# Altium schematic symbol library 13-Logic 数字 IC.SchLib: 324 symbols (part 7 of 30)

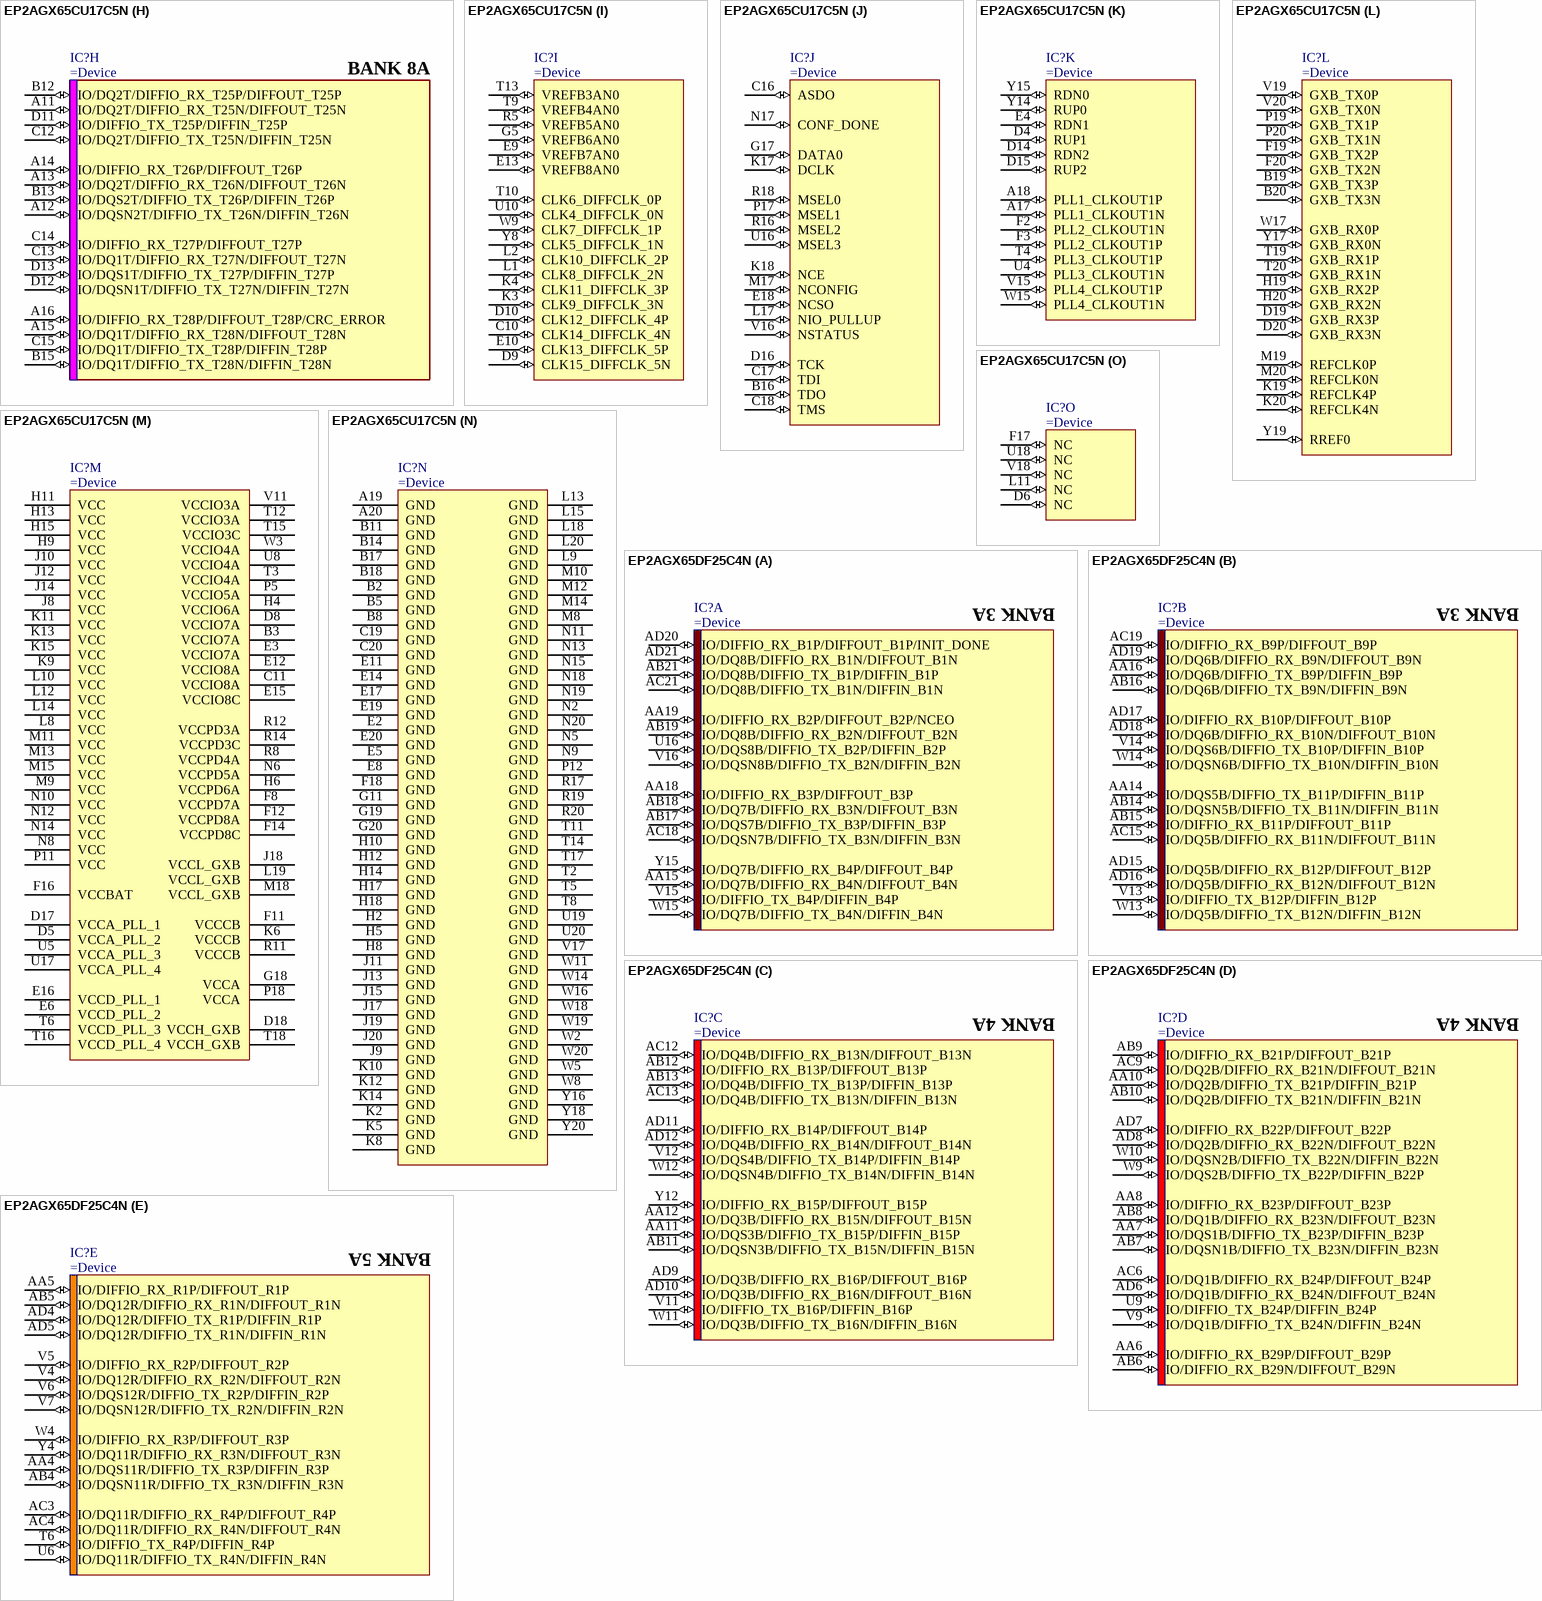
[diagram p38: symbols EP2AGX65CU17C5N to EP2AGX65DF25C4N]

## EP2AGX65CU17C5N
designator IC?
part A pins: U11 IO/DIFFIO_TX_B4P/DIFFIN_B4P (io), U12 IO/DQ5B/DIFFIO_TX_B4N/DIFFIN_B4N (io), U13 IO/DIFFIO_RX_B3P/DIFFOUT_B3P (io), U14 IO/DQS6B/DIFFIO_TX_B2P/DIFFIN_B2P (io), U15 IO/DQSN6B/DIFFIO_TX_B2N/DIFFIN_B2N (io), V12 IO/DQ5B/DIFFIO_RX_B3N/DIFFOUT_B3N (io), V13 IO/DQ6B/DIFFIO_TX_B1P/DIFFIN_B1P (io), V14 IO/DQ6B/DIFFIO_TX_B1N/DIFFIN_B1N (io), W10 IO/DQ5B/DIFFIO_RX_B4P/DIFFOUT_B4P (io), W12 IO/DIFFIO_RX_B2P/DIFFOUT_B2P/NCEO (io), W13 IO/DIFFIO_RX_B1P/DIFFOUT_B1P/INIT_DONE (io), Y9 IO/DQ5B/DIFFIO_RX_B4N/DIFFOUT_B4N (io), Y10 IO/DQS5B/DIFFIO_TX_B3P/DIFFIN_B3P (io), Y11 IO/DQSN5B/DIFFIO_TX_B3N/DIFFIN_B3N (io), Y12 IO/DQ6B/DIFFIO_RX_B2N/DIFFOUT_B2N (io), Y13 IO/DQ6B/DIFFIO_RX_B1N/DIFFOUT_B1N (io)
part B pins: U7 IO/DQS4B/DIFFIO_TX_B14P/DIFFIN_B14P (io), U9 IO/DIFFIO_TX_B16P/DIFFIN_B16P (io), V7 IO/DQSN4B/DIFFIO_TX_B14N/DIFFIN_B14N (io), V8 IO/DQ3B/DIFFIO_TX_B16N/DIFFIN_B16N (io), V9 IO/DQ4B/DIFFIO_TX_B13P/DIFFIN_B13P (io), V10 IO/DQ4B/DIFFIO_TX_B13N/DIFFIN_B13N (io), W1 IO/DQ3B/DIFFIO_RX_B16P/DIFFOUT_B16P (io), W6 IO/DIFFIO_RX_B14P/DIFFOUT_B14P (io), W7 IO/DIFFIO_RX_B13P/DIFFOUT_B13P (io), Y1 IO/DQ3B/DIFFIO_RX_B16N/DIFFOUT_B16N (io), Y2 IO/DQS3B/DIFFIO_TX_B15P/DIFFIN_B15P (io), Y3 IO/DQSN3B/DIFFIO_TX_B15N/DIFFIN_B15N (io), Y4 IO/DIFFIO_RX_B15P/DIFFOUT_B15P (io), Y5 IO/DQ3B/DIFFIO_RX_B15N/DIFFOUT_B15N (io), Y6 IO/DQ4B/DIFFIO_RX_B14N/DIFFOUT_B14N (io), Y7 IO/DQ4B/DIFFIO_RX_B13N/DIFFOUT_B13N (io)
part C pins: P3 IO/DQ1B/DIFFIO_RX_B24P/DIFFOUT_B24P (io), P4 IO/DIFFIO_RX_B29P/DIFFOUT_B29P (io), P6 IO/DQS2B/DIFFIO_TX_B22P/DIFFIN_B22P (io), R3 IO/DQ1B/DIFFIO_RX_B24N/DIFFOUT_B24N (io), R4 IO/DIFFIO_RX_B29N/DIFFOUT_B29N (io), R6 IO/DQSN2B/DIFFIO_TX_B22N/DIFFIN_B22N (io), T7 IO/DIFFIO_TX_B24P/DIFFIN_B24P (io), U1 IO/DQ1B/DIFFIO_RX_B23N/DIFFOUT_B23N (io), U2 IO/DIFFIO_RX_B23P/DIFFOUT_B23P (io), U3 IO/DQS1B/DIFFIO_TX_B23P/DIFFIN_B23P (io), U6 IO/DQ1B/DIFFIO_TX_B24N/DIFFIN_B24N (io), V1 IO/DQ2B/DIFFIO_RX_B22N/DIFFOUT_B22N (io), V2 IO/DIFFIO_RX_B22P/DIFFOUT_B22P (io), V3 IO/DQSN1B/DIFFIO_TX_B23N/DIFFIN_B23N (io), V4 IO/DIFFIO_RX_B21P/DIFFOUT_B21P (io), V5 IO/DQ2B/DIFFIO_TX_B21P/DIFFIN_B21P (io), V6 IO/DQ2B/DIFFIO_TX_B21N/DIFFIN_B21N (io), W4 IO/DQ2B/DIFFIO_RX_B21N/DIFFOUT_B21N (io)
part D pins: L3 IO/DQ3R/DIFFIO_RX_R4N/DIFFOUT_R4N (io), L4 IO/DQ3R/DIFFIO_RX_R4P/DIFFOUT_R4P (io), L5 IO/DQS3R/DIFFIO_TX_R3P/DIFFIN_R3P (io), M1 IO/DQ4R/DIFFIO_RX_R2N/DIFFOUT_R2N (io), M2 IO/DIFFIO_RX_R2P/DIFFOUT_R2P (io), M3 IO/DIFFIO_RX_R3P/DIFFOUT_R3P (io), M4 IO/DQSN3R/DIFFIO_TX_R3N/DIFFIN_R3N (io), M5 IO/DIFFIO_TX_R4P/DIFFIN_R4P (io), N1 IO/DIFFIO_RX_R1P/DIFFOUT_R1P (io), N3 IO/DQ3R/DIFFIO_RX_R3N/DIFFOUT_R3N (io), N4 IO/DQ3R/DIFFIO_TX_R4N/DIFFIN_R4N (io), P1 IO/DQ4R/DIFFIO_RX_R1N/DIFFOUT_R1N (io), P2 IO/DQ4R/DIFFIO_TX_R1P/DIFFIN_R1P (io), R1 IO/DQ4R/DIFFIO_TX_R1N/DIFFIN_R1N (io), R2 IO/DQS4R/DIFFIO_TX_R2P/DIFFIN_R2P (io), T1 IO/DQSN4R/DIFFIO_TX_R2N/DIFFIN_R2N (io)
part E pins: F4 IO/DQ1R/DIFFIO_TX_R32N/DIFFIN_R32N (io), F5 IO/DIFFIO_TX_R32P/DIFFIN_R32P/DEV_CLRN (io), F6 IO/DQS2R/DIFFIO_TX_R30P/DIFFIN_R30P/DATA1 (io), G1 IO/DQ1R/DIFFIO_RX_R32N/DIFFOUT_R32N (io), G2 IO/DQ1R/DIFFIO_RX_R32P/DIFFOUT_R32P (io), G3 IO/DQ2R/DIFFIO_TX_R29N/DIFFIN_R29N/DATA7 (io), G4 IO/DQ2R/DIFFIO_TX_R29P/DIFFIN_R29P/DATA5 (io), G6 IO/DQSN2R/DIFFIO_TX_R30N/DIFFIN_R30N/DATA3 (io), H1 IO/DQSN1R/DIFFIO_TX_R31N/DIFFIN_R31N (io), H3 IO/DIFFIO_RX_R30P/DIFFOUT_R30P/CLKUSR (io), J1 IO/DIFFIO_RX_R31P/DIFFOUT_R31P/DEV_OE (io), J2 IO/DQS1R/DIFFIO_TX_R31P/DIFFIN_R31P (io), J3 IO/DQ2R/DIFFIO_RX_R30N/DIFFOUT_R30N/DATA2 (io), J4 IO/DQ2R/DIFFIO_RX_R29N/DIFFOUT_R29N/DATA6 (io), J5 IO/DIFFIO_RX_R29P/DIFFOUT_R29P/DATA4 (io), K1 IO/DQ1R/DIFFIO_RX_R31N/DIFFOUT_R31N (io)
part F pins: A1 IO/DIFFIO_RX_T8P/DIFFOUT_T8P (io), A2 IO/DQ5T/DIFFIO_TX_T8N/DIFFIN_T8N (io), A3 IO/DQ5T/DIFFIO_TX_T8P/DIFFIN_T8P (io), B1 IO/DQ5T/DIFFIO_RX_T8N/DIFFOUT_T8N (io), C1 IO/DQ6T/DIFFIO_RX_T6N/DIFFOUT_T6N (io), C2 IO/DIFFIO_RX_T6P/DIFFOUT_T6P (io), C3 IO/DQSN6T/DIFFIO_TX_T6N/DIFFIN_T6N (io), C4 IO/DQ5T/DIFFIO_RX_T7N/DIFFOUT_T7N (io), C5 IO/DIFFIO_RX_T7P/DIFFOUT_T7P (io), D1 IO/DQ6T/DIFFIO_RX_T5N/DIFFOUT_T5N (io), D2 IO/DQ6T/DIFFIO_RX_T5P/DIFFOUT_T5P (io), D3 IO/DQS6T/DIFFIO_TX_T6P/DIFFIN_T6P (io), D7 IO/DQSN5T/DIFFIO_TX_T7N/DIFFIN_T7N (io), E1 IO/DIFFIO_TX_T5P/DIFFIN_T5P (io), E7 IO/DQS5T/DIFFIO_TX_T7P/DIFFIN_T7P (io), F1 IO/DQ6T/DIFFIO_TX_T5N/DIFFIN_T5N (io)
part G pins: A4 IO/DQ4T/DIFFIO_RX_T13N/DIFFOUT_T13N (io), A5 IO/DQ4T/DIFFIO_RX_T14N/DIFFOUT_T14N (io), A6 IO/DIFFIO_RX_T14P/DIFFOUT_T14P (io), A7 IO/DQ3T/DIFFIO_RX_T15N/DIFFOUT_T15N (io), A8 IO/DQ3T/DIFFIO_RX_T16N/DIFFOUT_T16N (io), A9 IO/DQ3T/DIFFIO_TX_T16N/DIFFIN_T16N (io), A10 IO/DQSN3T/DIFFIO_TX_T15N/DIFFIN_T15N (io), B4 IO/DQ4T/DIFFIO_RX_T13P/DIFFOUT_T13P (io), B6 IO/DIFFIO_RX_T15P/DIFFOUT_T15P (io), B7 IO/DIFFIO_RX_T16P/DIFFOUT_T16P (io), B9 IO/DQ3T/DIFFIO_TX_T16P/DIFFIN_T16P (io), B10 IO/DQS3T/DIFFIO_TX_T15P/DIFFIN_T15P (io), C6 IO/DQ4T/DIFFIO_TX_T13N/DIFFIN_T13N (io), C7 IO/DIFFIO_TX_T13P/DIFFIN_T13P (io), C8 IO/DQSN4T/DIFFIO_TX_T14N/DIFFIN_T14N (io), C9 IO/DQS4T/DIFFIO_TX_T14P/DIFFIN_T14P (io)
part H pins: A11 IO/DQ2T/DIFFIO_RX_T25N/DIFFOUT_T25N (io), A12 IO/DQSN2T/DIFFIO_TX_T26N/DIFFIN_T26N (io), A13 IO/DQ2T/DIFFIO_RX_T26N/DIFFOUT_T26N (io), A14 IO/DIFFIO_RX_T26P/DIFFOUT_T26P (io), A15 IO/DQ1T/DIFFIO_RX_T28N/DIFFOUT_T28N (io), A16 IO/DIFFIO_RX_T28P/DIFFOUT_T28P/CRC_ERROR (io), B12 IO/DQ2T/DIFFIO_RX_T25P/DIFFOUT_T25P (io), B13 IO/DQS2T/DIFFIO_TX_T26P/DIFFIN_T26P (io), B15 IO/DQ1T/DIFFIO_TX_T28N/DIFFIN_T28N (io), C12 IO/DQ2T/DIFFIO_TX_T25N/DIFFIN_T25N (io), C13 IO/DQ1T/DIFFIO_RX_T27N/DIFFOUT_T27N (io), C14 IO/DIFFIO_RX_T27P/DIFFOUT_T27P (io), C15 IO/DQ1T/DIFFIO_TX_T28P/DIFFIN_T28P (io), D11 IO/DIFFIO_TX_T25P/DIFFIN_T25P (io), D12 IO/DQSN1T/DIFFIO_TX_T27N/DIFFIN_T27N (io), D13 IO/DQS1T/DIFFIO_TX_T27P/DIFFIN_T27P (io)
part I pins: C10 CLK14_DIFFCLK_4N (io), D9 CLK15_DIFFCLK_5N (io), D10 CLK12_DIFFCLK_4P (io), E9 VREFB7AN0 (io), E10 CLK13_DIFFCLK_5P (io), E13 VREFB8AN0 (io), G5 VREFB6AN0 (io), K3 CLK9_DIFFCLK_3N (io), K4 CLK11_DIFFCLK_3P (io), L1 CLK8_DIFFCLK_2N (io), L2 CLK10_DIFFCLK_2P (io), R5 VREFB5AN0 (io), T9 VREFB4AN0 (io), T10 CLK6_DIFFCLK_0P (io), T13 VREFB3AN0 (io), U10 CLK4_DIFFCLK_0N (io), W9 CLK7_DIFFCLK_1P (io), Y8 CLK5_DIFFCLK_1N (io)
part J pins: B16 TDO (io), C16 ASDO (io), C17 TDI (io), C18 TMS (io), D16 TCK (io), E18 NCSO (io), G17 DATA0 (io), K17 DCLK (io), K18 NCE (io), L17 NIO_PULLUP (io), M17 NCONFIG (io), N17 CONF_DONE (io), P17 MSEL1 (io), R16 MSEL2 (io), R18 MSEL0 (io), U16 MSEL3 (io), V16 NSTATUS (io)
part K pins: A17 PLL1_CLKOUT1N (io), A18 PLL1_CLKOUT1P (io), D4 RUP1 (io), D14 RDN2 (io), D15 RUP2 (io), E4 RDN1 (io), F2 PLL2_CLKOUT1N (io), F3 PLL2_CLKOUT1P (io), T4 PLL3_CLKOUT1P (io), U4 PLL3_CLKOUT1N (io), V15 PLL4_CLKOUT1P (io), W15 PLL4_CLKOUT1N (io), Y14 RUP0 (io), Y15 RDN0 (io)
part L pins: B19 GXB_TX3P (io), B20 GXB_TX3N (io), D19 GXB_RX3P (io), D20 GXB_RX3N (io), F19 GXB_TX2P (io), F20 GXB_TX2N (io), H19 GXB_RX2P (io), H20 GXB_RX2N (io), K19 REFCLK4P (io), K20 REFCLK4N (io), M19 REFCLK0P (io), M20 REFCLK0N (io), P19 GXB_TX1P (io), P20 GXB_TX1N (io), T19 GXB_RX1P (io), T20 GXB_RX1N (io), V19 GXB_TX0P (io), V20 GXB_TX0N (io), W17 GXB_RX0P (io), Y17 GXB_RX0N (io), Y19 RREF0 (io)
part M pins: B3 VCCIO7A (power), C11 VCCIO8A (power), D5 VCCA_PLL_2 (power), D8 VCCIO7A (power), D17 VCCA_PLL_1 (power), D18 VCCH_GXB (power), E3 VCCIO7A (power), E6 VCCD_PLL_2 (power), E12 VCCIO8A (power), E15 VCCIO8C (power), E16 VCCD_PLL_1 (power), F8 VCCPD7A (power), F11 VCCCB (power), F12 VCCPD8A (power), F14 VCCPD8C (power), F16 VCCBAT (power), G18 VCCA (power), H4 VCCIO6A (power), H6 VCCPD6A (power), H9 VCC (power), H11 VCC (power), H13 VCC (power), H15 VCC (power), J8 VCC (power), J10 VCC (power), J12 VCC (power), J14 VCC (power), J18 VCCL_GXB (power), K6 VCCCB (power), K9 VCC (power), K11 VCC (power), K13 VCC (power), K15 VCC (power), L8 VCC (power), L10 VCC (power), L12 VCC (power), L14 VCC (power), L19 VCCL_GXB (power), M9 VCC (power), M11 VCC (power), M13 VCC (power), M15 VCC (power), M18 VCCL_GXB (power), N6 VCCPD5A (power), N8 VCC (power), N10 VCC (power), N12 VCC (power), N14 VCC (power), P5 VCCIO5A (power), P11 VCC (power), P18 VCCA (power), R8 VCCPD4A (power), R11 VCCCB (power), R12 VCCPD3A (power), R14 VCCPD3C (power), T3 VCCIO4A (power), T6 VCCD_PLL_3 (power), T12 VCCIO3A (power), T15 VCCIO3C (power), T16 VCCD_PLL_4 (power), T18 VCCH_GXB (power), U5 VCCA_PLL_3 (power), U8 VCCIO4A (power), U17 VCCA_PLL_4 (power), V11 VCCIO3A (power), W3 VCCIO4A (power)
part N pins: A19 GND (power), A20 GND (power), B2 GND (power), B5 GND (power), B8 GND (power), B11 GND (power), B14 GND (power), B17 GND (power), B18 GND (power), C19 GND (power), C20 GND (power), E2 GND (power), E5 GND (power), E8 GND (power), E11 GND (power), E14 GND (power), E17 GND (power), E19 GND (power), E20 GND (power), F18 GND (power), G11 GND (power), G19 GND (power), G20 GND (power), H2 GND (power), H5 GND (power), H8 GND (power), H10 GND (power), H12 GND (power), H14 GND (power), H17 GND (power), H18 GND (power), J9 GND (power), J11 GND (power), J13 GND (power), J15 GND (power), J17 GND (power), J19 GND (power), J20 GND (power), K2 GND (power), K5 GND (power), K8 GND (power), K10 GND (power), K12 GND (power), K14 GND (power), L9 GND (power), L13 GND (power), L15 GND (power), L18 GND (power), L20 GND (power), M8 GND (power), M10 GND (power), M12 GND (power), M14 GND (power), N2 GND (power), N5 GND (power), N9 GND (power), N11 GND (power), N13 GND (power), N15 GND (power), N18 GND (power), N19 GND (power), N20 GND (power), P12 GND (power), R17 GND (power), R19 GND (power), R20 GND (power), T2 GND (power), T5 GND (power), T8 GND (power), T11 GND (power), T14 GND (power), T17 GND (power), U19 GND (power), U20 GND (power), V17 GND (power), W2 GND (power), W5 GND (power), W8 GND (power), W11 GND (power), W14 GND (power), W16 GND (power), W18 GND (power), W19 GND (power), W20 GND (power), Y16 GND (power), Y18 GND (power), Y20 GND (power)
part O pins: D6 NC (io), F17 NC (io), L11 NC (io), U18 NC (io), V18 NC (io)
part A text: BANK 3A
part B text: BANK 4A
part C text: BANK 4A
part D text: BANK 5A
part E text: BANK 6A
part F text: BANK 7A
part G text: BANK 7A
part H text: BANK 8A

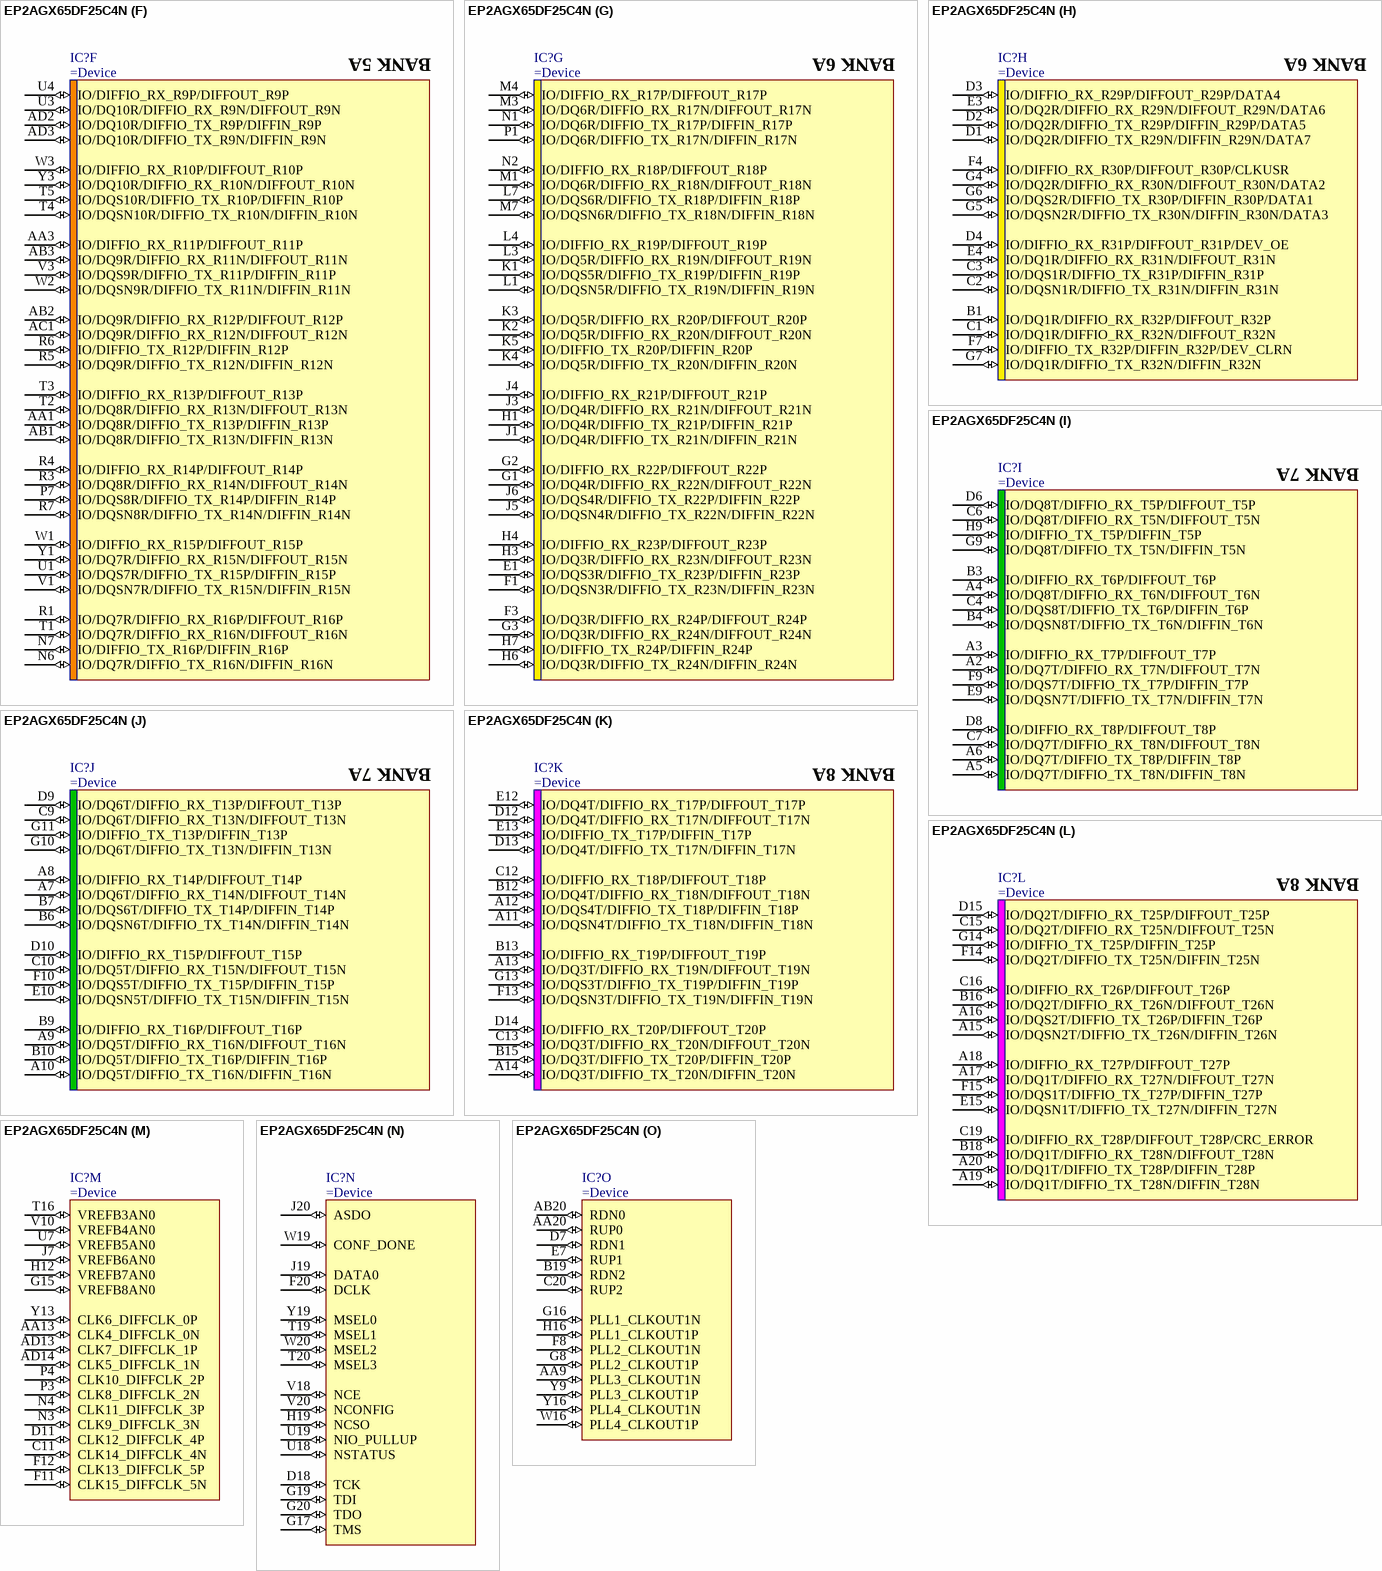
[diagram p39: symbol EP2AGX65DF25C4N]

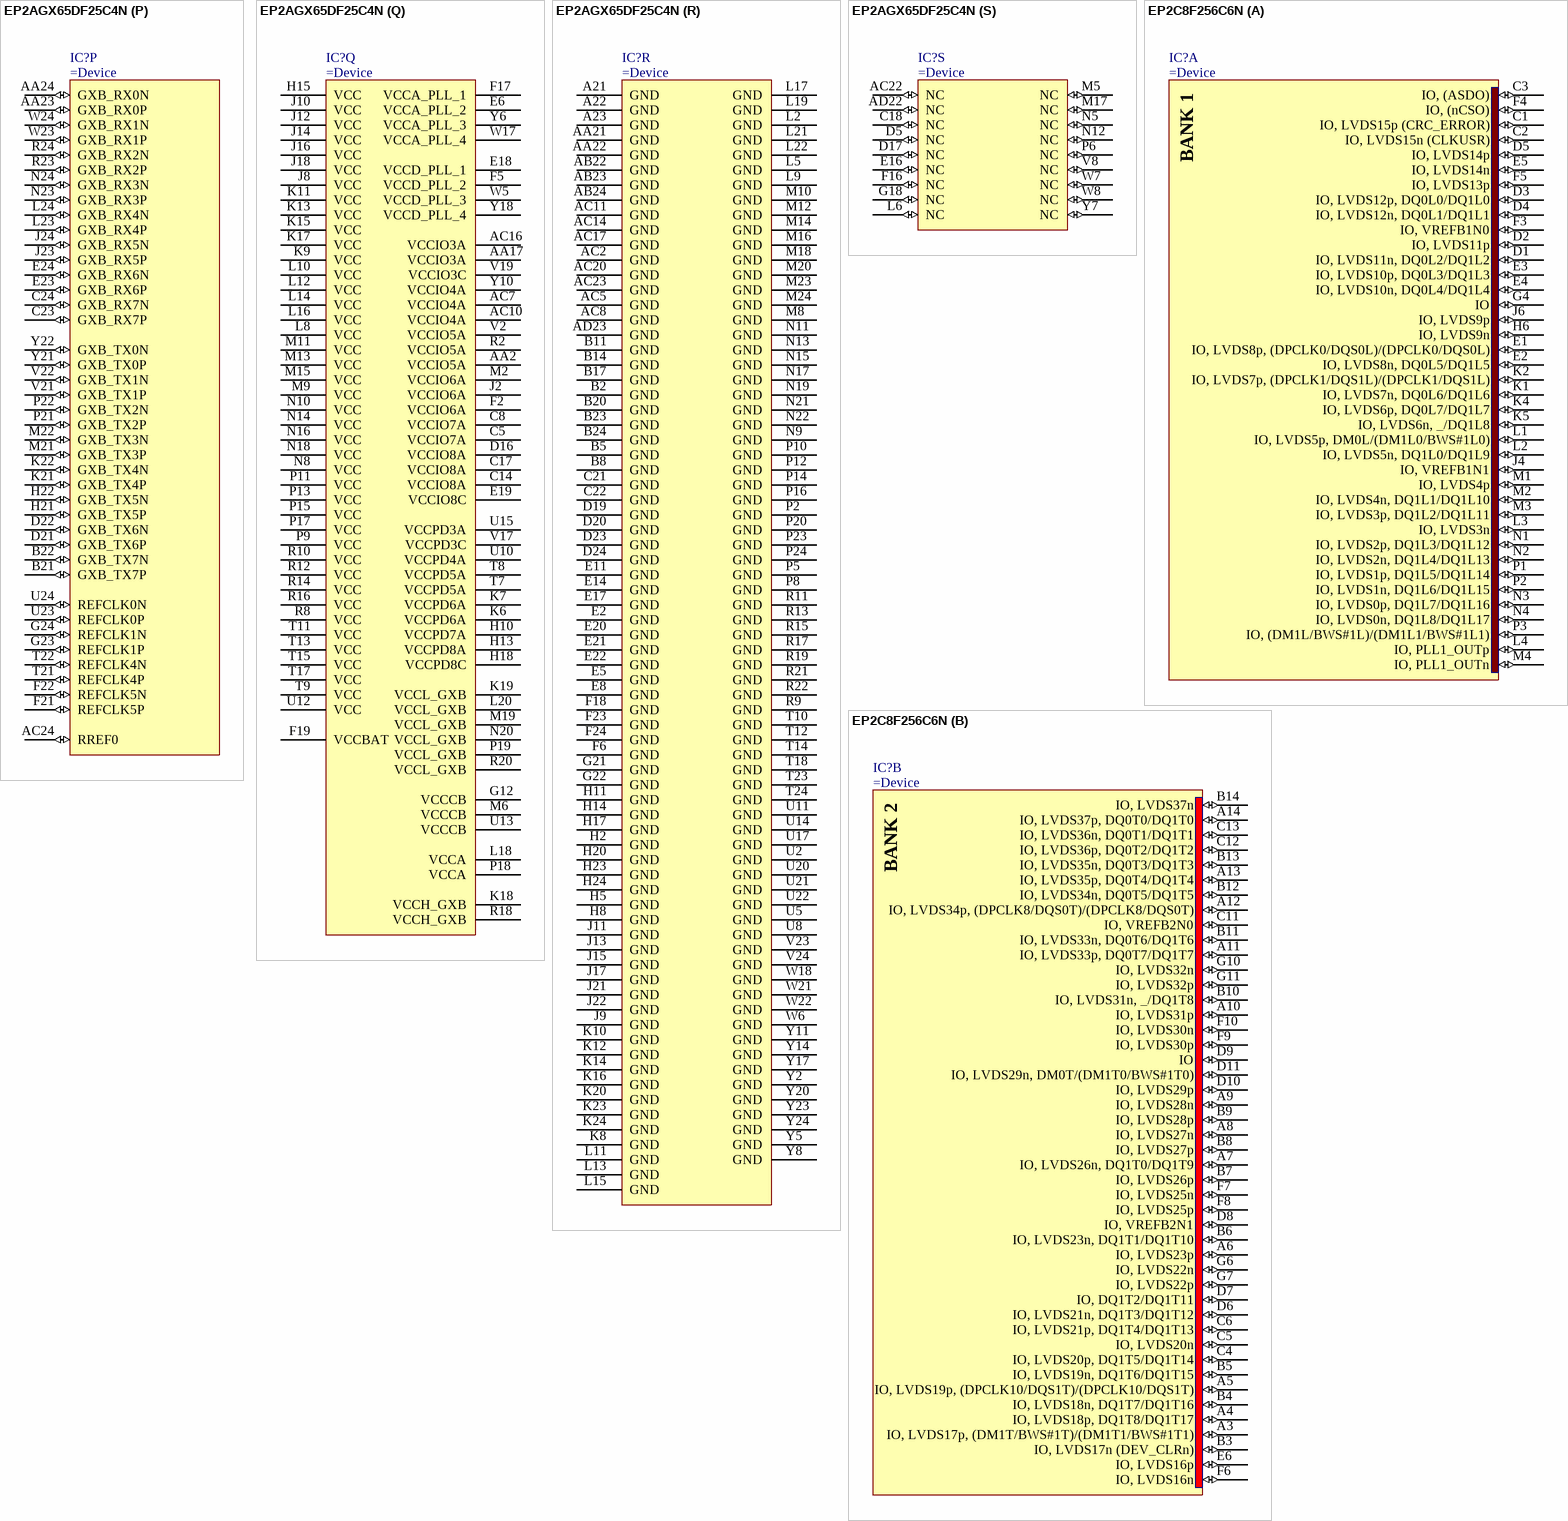
[diagram p40: symbols EP2AGX65DF25C4N to EP2C8F256C6N]

## EP2AGX65DF25C4N
designator IC?
part A pins: AA15 IO/DQ7B/DIFFIO_RX_B4N/DIFFOUT_B4N (io), AA18 IO/DIFFIO_RX_B3P/DIFFOUT_B3P (io), AA19 IO/DIFFIO_RX_B2P/DIFFOUT_B2P/NCEO (io), AB17 IO/DQS7B/DIFFIO_TX_B3P/DIFFIN_B3P (io), AB18 IO/DQ7B/DIFFIO_RX_B3N/DIFFOUT_B3N (io), AB19 IO/DQ8B/DIFFIO_RX_B2N/DIFFOUT_B2N (io), AB21 IO/DQ8B/DIFFIO_TX_B1P/DIFFIN_B1P (io), AC18 IO/DQSN7B/DIFFIO_TX_B3N/DIFFIN_B3N (io), AC21 IO/DQ8B/DIFFIO_TX_B1N/DIFFIN_B1N (io), AD20 IO/DIFFIO_RX_B1P/DIFFOUT_B1P/INIT_DONE (io), AD21 IO/DQ8B/DIFFIO_RX_B1N/DIFFOUT_B1N (io), U16 IO/DQS8B/DIFFIO_TX_B2P/DIFFIN_B2P (io), V15 IO/DIFFIO_TX_B4P/DIFFIN_B4P (io), V16 IO/DQSN8B/DIFFIO_TX_B2N/DIFFIN_B2N (io), W15 IO/DQ7B/DIFFIO_TX_B4N/DIFFIN_B4N (io), Y15 IO/DQ7B/DIFFIO_RX_B4P/DIFFOUT_B4P (io)
part B pins: AA14 IO/DQS5B/DIFFIO_TX_B11P/DIFFIN_B11P (io), AA16 IO/DQ6B/DIFFIO_TX_B9P/DIFFIN_B9P (io), AB14 IO/DQSN5B/DIFFIO_TX_B11N/DIFFIN_B11N (io), AB15 IO/DIFFIO_RX_B11P/DIFFOUT_B11P (io), AB16 IO/DQ6B/DIFFIO_TX_B9N/DIFFIN_B9N (io), AC15 IO/DQ5B/DIFFIO_RX_B11N/DIFFOUT_B11N (io), AC19 IO/DIFFIO_RX_B9P/DIFFOUT_B9P (io), AD15 IO/DQ5B/DIFFIO_RX_B12P/DIFFOUT_B12P (io), AD16 IO/DQ5B/DIFFIO_RX_B12N/DIFFOUT_B12N (io), AD17 IO/DIFFIO_RX_B10P/DIFFOUT_B10P (io), AD18 IO/DQ6B/DIFFIO_RX_B10N/DIFFOUT_B10N (io), AD19 IO/DQ6B/DIFFIO_RX_B9N/DIFFOUT_B9N (io), V13 IO/DIFFIO_TX_B12P/DIFFIN_B12P (io), V14 IO/DQS6B/DIFFIO_TX_B10P/DIFFIN_B10P (io), W13 IO/DQ5B/DIFFIO_TX_B12N/DIFFIN_B12N (io), W14 IO/DQSN6B/DIFFIO_TX_B10N/DIFFIN_B10N (io)
part C pins: AA11 IO/DQS3B/DIFFIO_TX_B15P/DIFFIN_B15P (io), AA12 IO/DQ3B/DIFFIO_RX_B15N/DIFFOUT_B15N (io), AB11 IO/DQSN3B/DIFFIO_TX_B15N/DIFFIN_B15N (io), AB12 IO/DIFFIO_RX_B13P/DIFFOUT_B13P (io), AB13 IO/DQ4B/DIFFIO_TX_B13P/DIFFIN_B13P (io), AC12 IO/DQ4B/DIFFIO_RX_B13N/DIFFOUT_B13N (io), AC13 IO/DQ4B/DIFFIO_TX_B13N/DIFFIN_B13N (io), AD9 IO/DQ3B/DIFFIO_RX_B16P/DIFFOUT_B16P (io), AD10 IO/DQ3B/DIFFIO_RX_B16N/DIFFOUT_B16N (io), AD11 IO/DIFFIO_RX_B14P/DIFFOUT_B14P (io), AD12 IO/DQ4B/DIFFIO_RX_B14N/DIFFOUT_B14N (io), V11 IO/DIFFIO_TX_B16P/DIFFIN_B16P (io), V12 IO/DQS4B/DIFFIO_TX_B14P/DIFFIN_B14P (io), W11 IO/DQ3B/DIFFIO_TX_B16N/DIFFIN_B16N (io), W12 IO/DQSN4B/DIFFIO_TX_B14N/DIFFIN_B14N (io), Y12 IO/DIFFIO_RX_B15P/DIFFOUT_B15P (io)
part D pins: AA6 IO/DIFFIO_RX_B29P/DIFFOUT_B29P (io), AA7 IO/DQS1B/DIFFIO_TX_B23P/DIFFIN_B23P (io), AA8 IO/DIFFIO_RX_B23P/DIFFOUT_B23P (io), AA10 IO/DQ2B/DIFFIO_TX_B21P/DIFFIN_B21P (io), AB6 IO/DIFFIO_RX_B29N/DIFFOUT_B29N (io), AB7 IO/DQSN1B/DIFFIO_TX_B23N/DIFFIN_B23N (io), AB8 IO/DQ1B/DIFFIO_RX_B23N/DIFFOUT_B23N (io), AB9 IO/DIFFIO_RX_B21P/DIFFOUT_B21P (io), AB10 IO/DQ2B/DIFFIO_TX_B21N/DIFFIN_B21N (io), AC6 IO/DQ1B/DIFFIO_RX_B24P/DIFFOUT_B24P (io), AC9 IO/DQ2B/DIFFIO_RX_B21N/DIFFOUT_B21N (io), AD6 IO/DQ1B/DIFFIO_RX_B24N/DIFFOUT_B24N (io), AD7 IO/DIFFIO_RX_B22P/DIFFOUT_B22P (io), AD8 IO/DQ2B/DIFFIO_RX_B22N/DIFFOUT_B22N (io), U9 IO/DIFFIO_TX_B24P/DIFFIN_B24P (io), V9 IO/DQ1B/DIFFIO_TX_B24N/DIFFIN_B24N (io), W9 IO/DQS2B/DIFFIO_TX_B22P/DIFFIN_B22P (io), W10 IO/DQSN2B/DIFFIO_TX_B22N/DIFFIN_B22N (io)
part E pins: AA4 IO/DQS11R/DIFFIO_TX_R3P/DIFFIN_R3P (io), AA5 IO/DIFFIO_RX_R1P/DIFFOUT_R1P (io), AB4 IO/DQSN11R/DIFFIO_TX_R3N/DIFFIN_R3N (io), AB5 IO/DQ12R/DIFFIO_RX_R1N/DIFFOUT_R1N (io), AC3 IO/DQ11R/DIFFIO_RX_R4P/DIFFOUT_R4P (io), AC4 IO/DQ11R/DIFFIO_RX_R4N/DIFFOUT_R4N (io), AD4 IO/DQ12R/DIFFIO_TX_R1P/DIFFIN_R1P (io), AD5 IO/DQ12R/DIFFIO_TX_R1N/DIFFIN_R1N (io), T6 IO/DIFFIO_TX_R4P/DIFFIN_R4P (io), U6 IO/DQ11R/DIFFIO_TX_R4N/DIFFIN_R4N (io), V4 IO/DQ12R/DIFFIO_RX_R2N/DIFFOUT_R2N (io), V5 IO/DIFFIO_RX_R2P/DIFFOUT_R2P (io), V6 IO/DQS12R/DIFFIO_TX_R2P/DIFFIN_R2P (io), V7 IO/DQSN12R/DIFFIO_TX_R2N/DIFFIN_R2N (io), W4 IO/DIFFIO_RX_R3P/DIFFOUT_R3P (io), Y4 IO/DQ11R/DIFFIO_RX_R3N/DIFFOUT_R3N (io)
part F pins: AA1 IO/DQ8R/DIFFIO_TX_R13P/DIFFIN_R13P (io), AA3 IO/DIFFIO_RX_R11P/DIFFOUT_R11P (io), AB1 IO/DQ8R/DIFFIO_TX_R13N/DIFFIN_R13N (io), AB2 IO/DQ9R/DIFFIO_RX_R12P/DIFFOUT_R12P (io), AB3 IO/DQ9R/DIFFIO_RX_R11N/DIFFOUT_R11N (io), AC1 IO/DQ9R/DIFFIO_RX_R12N/DIFFOUT_R12N (io), AD2 IO/DQ10R/DIFFIO_TX_R9P/DIFFIN_R9P (io), AD3 IO/DQ10R/DIFFIO_TX_R9N/DIFFIN_R9N (io), N6 IO/DQ7R/DIFFIO_TX_R16N/DIFFIN_R16N (io), N7 IO/DIFFIO_TX_R16P/DIFFIN_R16P (io), P7 IO/DQS8R/DIFFIO_TX_R14P/DIFFIN_R14P (io), R1 IO/DQ7R/DIFFIO_RX_R16P/DIFFOUT_R16P (io), R3 IO/DQ8R/DIFFIO_RX_R14N/DIFFOUT_R14N (io), R4 IO/DIFFIO_RX_R14P/DIFFOUT_R14P (io), R5 IO/DQ9R/DIFFIO_TX_R12N/DIFFIN_R12N (io), R6 IO/DIFFIO_TX_R12P/DIFFIN_R12P (io), R7 IO/DQSN8R/DIFFIO_TX_R14N/DIFFIN_R14N (io), T1 IO/DQ7R/DIFFIO_RX_R16N/DIFFOUT_R16N (io), T2 IO/DQ8R/DIFFIO_RX_R13N/DIFFOUT_R13N (io), T3 IO/DIFFIO_RX_R13P/DIFFOUT_R13P (io), T4 IO/DQSN10R/DIFFIO_TX_R10N/DIFFIN_R10N (io), T5 IO/DQS10R/DIFFIO_TX_R10P/DIFFIN_R10P (io), U1 IO/DQS7R/DIFFIO_TX_R15P/DIFFIN_R15P (io), U3 IO/DQ10R/DIFFIO_RX_R9N/DIFFOUT_R9N (io), U4 IO/DIFFIO_RX_R9P/DIFFOUT_R9P (io), V1 IO/DQSN7R/DIFFIO_TX_R15N/DIFFIN_R15N (io), V3 IO/DQS9R/DIFFIO_TX_R11P/DIFFIN_R11P (io), W1 IO/DIFFIO_RX_R15P/DIFFOUT_R15P (io), W2 IO/DQSN9R/DIFFIO_TX_R11N/DIFFIN_R11N (io), W3 IO/DIFFIO_RX_R10P/DIFFOUT_R10P (io), Y1 IO/DQ7R/DIFFIO_RX_R15N/DIFFOUT_R15N (io), Y3 IO/DQ10R/DIFFIO_RX_R10N/DIFFOUT_R10N (io)
part G pins: E1 IO/DQS3R/DIFFIO_TX_R23P/DIFFIN_R23P (io), F1 IO/DQSN3R/DIFFIO_TX_R23N/DIFFIN_R23N (io), F3 IO/DQ3R/DIFFIO_RX_R24P/DIFFOUT_R24P (io), G1 IO/DQ4R/DIFFIO_RX_R22N/DIFFOUT_R22N (io), G2 IO/DIFFIO_RX_R22P/DIFFOUT_R22P (io), G3 IO/DQ3R/DIFFIO_RX_R24N/DIFFOUT_R24N (io), H1 IO/DQ4R/DIFFIO_TX_R21P/DIFFIN_R21P (io), H3 IO/DQ3R/DIFFIO_RX_R23N/DIFFOUT_R23N (io), H4 IO/DIFFIO_RX_R23P/DIFFOUT_R23P (io), H6 IO/DQ3R/DIFFIO_TX_R24N/DIFFIN_R24N (io), H7 IO/DIFFIO_TX_R24P/DIFFIN_R24P (io), J1 IO/DQ4R/DIFFIO_TX_R21N/DIFFIN_R21N (io), J3 IO/DQ4R/DIFFIO_RX_R21N/DIFFOUT_R21N (io), J4 IO/DIFFIO_RX_R21P/DIFFOUT_R21P (io), J5 IO/DQSN4R/DIFFIO_TX_R22N/DIFFIN_R22N (io), J6 IO/DQS4R/DIFFIO_TX_R22P/DIFFIN_R22P (io), K1 IO/DQS5R/DIFFIO_TX_R19P/DIFFIN_R19P (io), K2 IO/DQ5R/DIFFIO_RX_R20N/DIFFOUT_R20N (io), K3 IO/DQ5R/DIFFIO_RX_R20P/DIFFOUT_R20P (io), K4 IO/DQ5R/DIFFIO_TX_R20N/DIFFIN_R20N (io), K5 IO/DIFFIO_TX_R20P/DIFFIN_R20P (io), L1 IO/DQSN5R/DIFFIO_TX_R19N/DIFFIN_R19N (io), L3 IO/DQ5R/DIFFIO_RX_R19N/DIFFOUT_R19N (io), L4 IO/DIFFIO_RX_R19P/DIFFOUT_R19P (io), L7 IO/DQS6R/DIFFIO_TX_R18P/DIFFIN_R18P (io), M1 IO/DQ6R/DIFFIO_RX_R18N/DIFFOUT_R18N (io), M3 IO/DQ6R/DIFFIO_RX_R17N/DIFFOUT_R17N (io), M4 IO/DIFFIO_RX_R17P/DIFFOUT_R17P (io), M7 IO/DQSN6R/DIFFIO_TX_R18N/DIFFIN_R18N (io), N1 IO/DQ6R/DIFFIO_TX_R17P/DIFFIN_R17P (io), N2 IO/DIFFIO_RX_R18P/DIFFOUT_R18P (io), P1 IO/DQ6R/DIFFIO_TX_R17N/DIFFIN_R17N (io)
part H pins: B1 IO/DQ1R/DIFFIO_RX_R32P/DIFFOUT_R32P (io), C1 IO/DQ1R/DIFFIO_RX_R32N/DIFFOUT_R32N (io), C2 IO/DQSN1R/DIFFIO_TX_R31N/DIFFIN_R31N (io), C3 IO/DQS1R/DIFFIO_TX_R31P/DIFFIN_R31P (io), D1 IO/DQ2R/DIFFIO_TX_R29N/DIFFIN_R29N/DATA7 (io), D2 IO/DQ2R/DIFFIO_TX_R29P/DIFFIN_R29P/DATA5 (io), D3 IO/DIFFIO_RX_R29P/DIFFOUT_R29P/DATA4 (io), D4 IO/DIFFIO_RX_R31P/DIFFOUT_R31P/DEV_OE (io), E3 IO/DQ2R/DIFFIO_RX_R29N/DIFFOUT_R29N/DATA6 (io), E4 IO/DQ1R/DIFFIO_RX_R31N/DIFFOUT_R31N (io), F4 IO/DIFFIO_RX_R30P/DIFFOUT_R30P/CLKUSR (io), F7 IO/DIFFIO_TX_R32P/DIFFIN_R32P/DEV_CLRN (io), G4 IO/DQ2R/DIFFIO_RX_R30N/DIFFOUT_R30N/DATA2 (io), G5 IO/DQSN2R/DIFFIO_TX_R30N/DIFFIN_R30N/DATA3 (io), G6 IO/DQS2R/DIFFIO_TX_R30P/DIFFIN_R30P/DATA1 (io), G7 IO/DQ1R/DIFFIO_TX_R32N/DIFFIN_R32N (io)
part I pins: A2 IO/DQ7T/DIFFIO_RX_T7N/DIFFOUT_T7N (io), A3 IO/DIFFIO_RX_T7P/DIFFOUT_T7P (io), A4 IO/DQ8T/DIFFIO_RX_T6N/DIFFOUT_T6N (io), A5 IO/DQ7T/DIFFIO_TX_T8N/DIFFIN_T8N (io), A6 IO/DQ7T/DIFFIO_TX_T8P/DIFFIN_T8P (io), B3 IO/DIFFIO_RX_T6P/DIFFOUT_T6P (io), B4 IO/DQSN8T/DIFFIO_TX_T6N/DIFFIN_T6N (io), C4 IO/DQS8T/DIFFIO_TX_T6P/DIFFIN_T6P (io), C6 IO/DQ8T/DIFFIO_RX_T5N/DIFFOUT_T5N (io), C7 IO/DQ7T/DIFFIO_RX_T8N/DIFFOUT_T8N (io), D6 IO/DQ8T/DIFFIO_RX_T5P/DIFFOUT_T5P (io), D8 IO/DIFFIO_RX_T8P/DIFFOUT_T8P (io), E9 IO/DQSN7T/DIFFIO_TX_T7N/DIFFIN_T7N (io), F9 IO/DQS7T/DIFFIO_TX_T7P/DIFFIN_T7P (io), G9 IO/DQ8T/DIFFIO_TX_T5N/DIFFIN_T5N (io), H9 IO/DIFFIO_TX_T5P/DIFFIN_T5P (io)
part J pins: A7 IO/DQ6T/DIFFIO_RX_T14N/DIFFOUT_T14N (io), A8 IO/DIFFIO_RX_T14P/DIFFOUT_T14P (io), A9 IO/DQ5T/DIFFIO_RX_T16N/DIFFOUT_T16N (io), A10 IO/DQ5T/DIFFIO_TX_T16N/DIFFIN_T16N (io), B6 IO/DQSN6T/DIFFIO_TX_T14N/DIFFIN_T14N (io), B7 IO/DQS6T/DIFFIO_TX_T14P/DIFFIN_T14P (io), B9 IO/DIFFIO_RX_T16P/DIFFOUT_T16P (io), B10 IO/DQ5T/DIFFIO_TX_T16P/DIFFIN_T16P (io), C9 IO/DQ6T/DIFFIO_RX_T13N/DIFFOUT_T13N (io), C10 IO/DQ5T/DIFFIO_RX_T15N/DIFFOUT_T15N (io), D9 IO/DQ6T/DIFFIO_RX_T13P/DIFFOUT_T13P (io), D10 IO/DIFFIO_RX_T15P/DIFFOUT_T15P (io), E10 IO/DQSN5T/DIFFIO_TX_T15N/DIFFIN_T15N (io), F10 IO/DQS5T/DIFFIO_TX_T15P/DIFFIN_T15P (io), G10 IO/DQ6T/DIFFIO_TX_T13N/DIFFIN_T13N (io), G11 IO/DIFFIO_TX_T13P/DIFFIN_T13P (io)